# Altium footprint library TarabusLibrary.PcbLib: 591 footprints (part 14 of 37)
Each footprint in its own frame and in the unit in brackets; x right, y up, seen from the top. Pads: shape width x height; smd on the part's side, far side on the other; paste and mask are expansions set on the pad; w line width, h text height; cw(c..) or ccw(c..) is an arc to the next point about the centre after c.
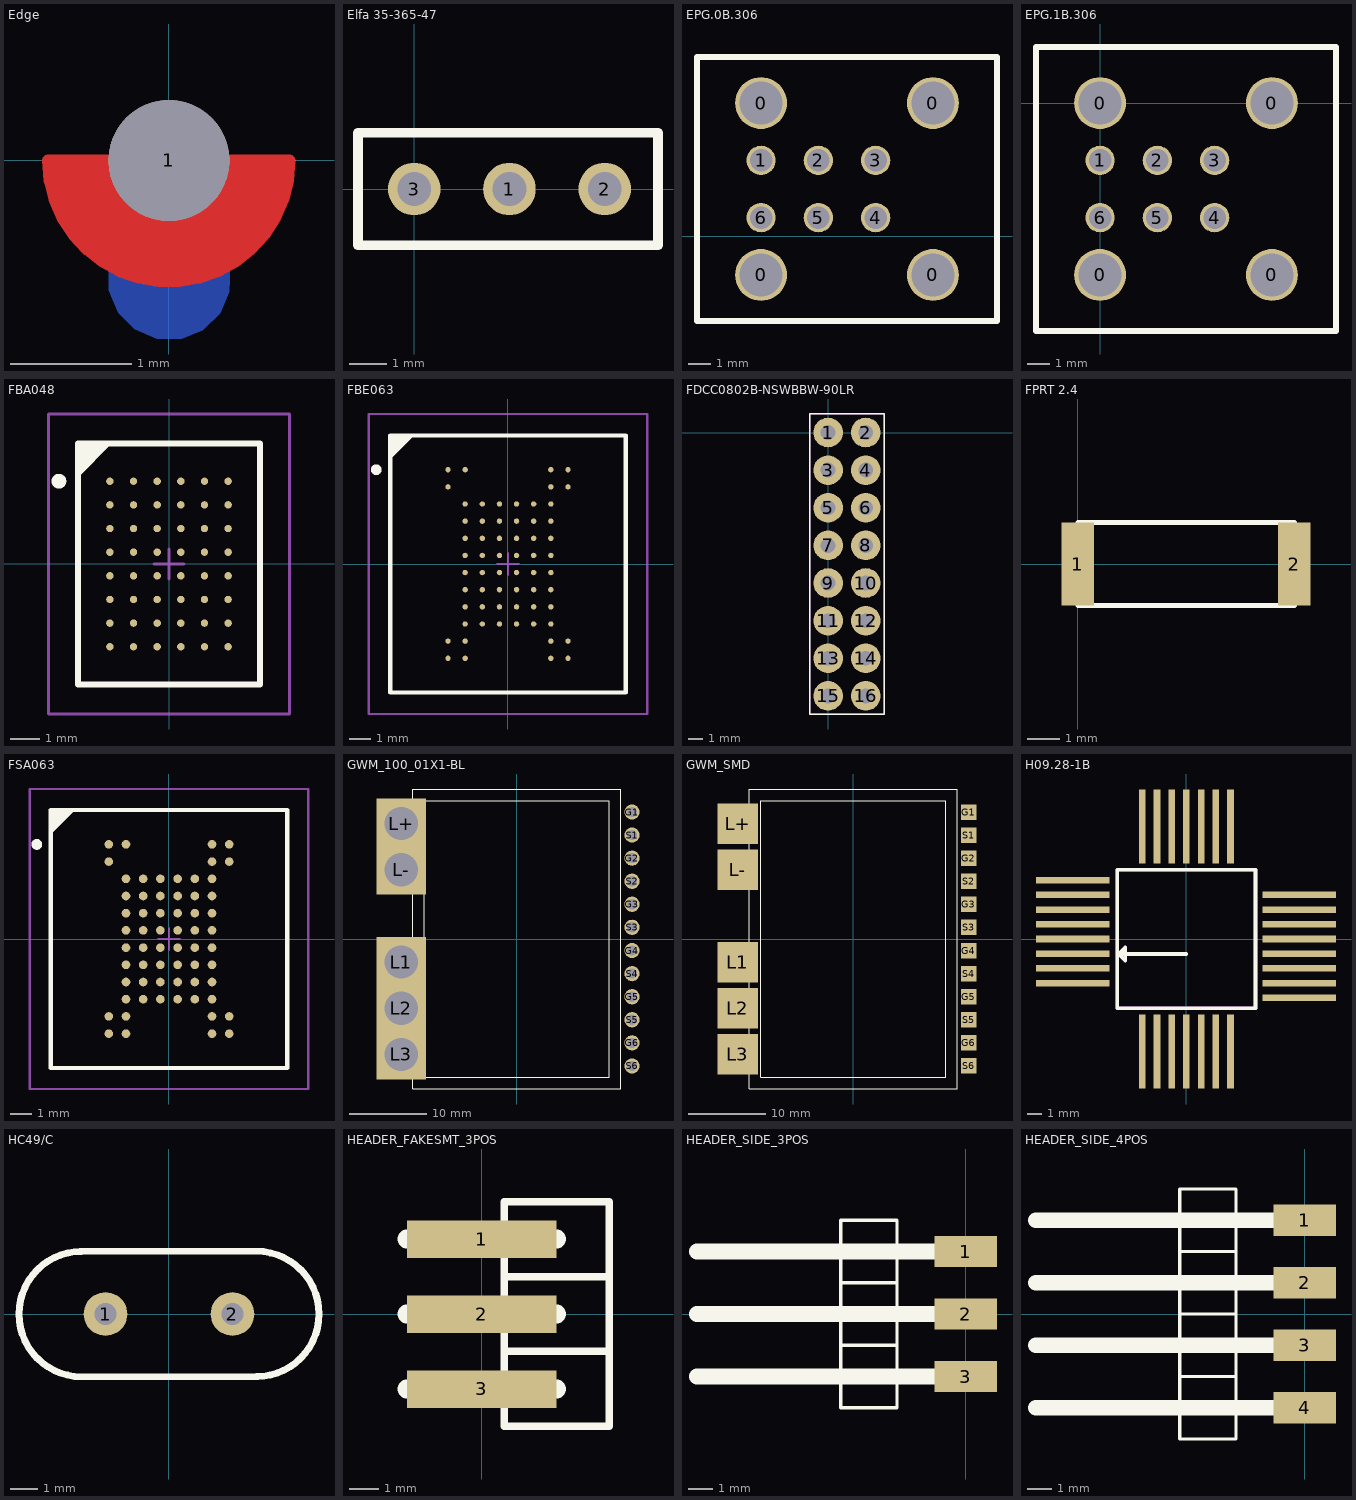
[diagram p13: the footprints below, top view; thin cyan lines are the x and y axes]

## Edge [mm]
pads (1):
  round 1 hole 1: 1(0,0)
Top Layer:
  region: -1,0 -1,-0.132 -0.932,-0.386 -0.8,-0.614 -0.614,-0.8 -0.386,-0.932 -0.132,-1 0.132,-1 0.386,-0.932 0.614,-0.8 0.8,-0.614 0.932,-0.386 1,-0.132 1,0
  lines w0.1: -1,0 ccw(c0,0) 1,0 ; -1,0 0,0 ; -1,0 0,0 ; 0,0 1,0 ; 0,0 1,0
Signal Layer 1:
  region: -0.998,0.006 -0.998,-0.126 -0.93,-0.38 -0.798,-0.609 -0.612,-0.795 -0.384,-0.926 -0.13,-0.994 0.134,-0.994 0.388,-0.926 0.616,-0.795 0.802,-0.609 0.934,-0.38 1.002,-0.126 1.002,0.005 1.002,0.006
  lines w0.1: -0.998,0.006 ccw(c0.002,0.006) 1.002,0.006 ; -0.998,0.006 0.002,0.006 ; -0.998,0.006 0.002,0.006 ; 0.002,0.006 1.002,0.006 ; 0.002,0.006 1.002,0.006
Signal Layer 2:
  region: -0.998,0.006 -0.998,-0.126 -0.93,-0.38 -0.798,-0.609 -0.612,-0.795 -0.384,-0.926 -0.13,-0.994 0.134,-0.994 0.388,-0.926 0.616,-0.795 0.802,-0.609 0.934,-0.38 1.002,-0.126 1.002,0.005 1.002,0.006
  lines w0.1: -0.998,0.006 ccw(c0.002,0.006) 1.002,0.006 ; -0.998,0.006 0.002,0.006 ; -0.998,0.006 0.002,0.006 ; 0.002,0.006 1.002,0.006 ; 0.002,0.006 1.002,0.006
Bottom Layer:
  region: -0.497,-0.977 -0.497,-1.076 -0.421,-1.259 -0.282,-1.4 -0.1,-1.477 0.098,-1.478 0.282,-1.405 0.423,-1.267 0.502,-1.085 0.504,-0.986 0.504,0.014 -0.496,0.014

## Elfa 35-365-47 [mm]
pads (3):
  round 1.4 hole 0.9: 1(2.54,0) 2(5.08,0) 3(0,0)
Top Overlay:
  lines w0.254: -1.5,-1.5 -1.5,1.5 6.5,1.5 6.5,-1.5 -1.5,-1.5

## EPG.0B.306 [mm]
pads (10):
  round 2.3 hole 1.9: 0(-13.5,-1.72) 0(-13.5,5.9) 0(-5.88,-1.72) 0(-5.88,5.9)
  round 1.3 hole 1: 1(-13.5,3.36) 2(-10.96,3.36) 3(-8.42,3.36) 4(-8.42,0.82) 5(-10.96,0.82) 6(-13.5,0.82)
Top Overlay:
  lines w0.254: -16.34,-3.76 -16.34,7.94 -3.04,7.94 -3.04,-3.76 -16.34,-3.76

## EPG.1B.306 [mm]
pads (10):
  round 2.3 hole 1.9: 0(0,-7.62) 0(0,0) 0(7.62,-7.62) 0(7.62,0)
  round 1.3 hole 1: 1(0,-2.54) 2(2.54,-2.54) 3(5.08,-2.54) 4(5.08,-5.08) 5(2.54,-5.08) 6(0,-5.08)
Top Overlay:
  lines w0.254: -2.84,-10.11 -2.84,2.49 10.46,2.49 10.46,-10.11 -2.84,-10.11

## FBA048 [mm] "48-Ball Fine Pitch Ball Grid Array Rectangular 0.8 mm Pitch"
height 1.2
pads (48):
  round 0.25 smd: A1(-2,2.8) A2(-1.2,2.8) A3(-0.4,2.8) A4(0.4,2.8) A5(1.2,2.8) A6(2,2.8) B1(-2,2) B2(-1.2,2) B3(-0.4,2) B4(0.4,2) B5(1.2,2) B6(2,2) C1(-2,1.2) C2(-1.2,1.2) C3(-0.4,1.2) C4(0.4,1.2) C5(1.2,1.2) C6(2,1.2) D1(-2,0.4) D2(-1.2,0.4) D3(-0.4,0.4) D4(0.4,0.4) D5(1.2,0.4) D6(2,0.4) E1(-2,-0.4) E2(-1.2,-0.4) E3(-0.4,-0.4) E4(0.4,-0.4) E5(1.2,-0.4) E6(2,-0.4) F1(-2,-1.2) F2(-1.2,-1.2) F3(-0.4,-1.2) F4(0.4,-1.2) F5(1.2,-1.2) F6(2,-1.2) G1(-2,-2) G2(-1.2,-2) G3(-0.4,-2) G4(0.4,-2) G5(1.2,-2) G6(2,-2) H1(-2,-2.8) H2(-1.2,-2.8) H3(-0.4,-2.8) H4(0.4,-2.8) H5(1.2,-2.8) H6(2,-2.8)
Top Overlay:
  circle w0.25: c-3.725,2.8 r0.125
  region: -2.075,4.075 -3.075,3.075 -3.075,4.075
  lines w0.2: -3.075,3.075 -2.075,4.075 ; -3.075,-4.075 -3.075,4.075 3.075,4.075 3.075,-4.075 -3.075,-4.075
Mechanical 13:
  lines w0.1: -3.075,-4.075 -3.075,4.075 3.075,4.075 3.075,-4.075 -3.075,-4.075
Mechanical 15:
  lines w0.1: -0.5,0 0.5,0 ; 0,-0.5 0,0.5 ; -4.075,-5.075 -4.075,5.075 4.075,5.075 4.075,-5.075 -4.075,-5.075
3D body: height 1.2, standoff 0, extent -3.075,-4.075 3.075,4.075

## FBE063 [mm] "63-Ball Fine Pitch Ball Grid Array Rectangular 0.8 mm Pitch"
height 1.2
pads (63):
  round 0.25 smd: A1(-2.8,4.4) A2(-2,4.4) A7(2,4.4) A8(2.8,4.4) B1(-2.8,3.6) B7(2,3.6) B8(2.8,3.6) C2(-2,2.8) C3(-1.2,2.8) C4(-0.4,2.8) C5(0.4,2.8) C6(1.2,2.8) C7(2,2.8) D2(-2,2) D3(-1.2,2) D4(-0.4,2) D5(0.4,2) D6(1.2,2) D7(2,2) E2(-2,1.2) E3(-1.2,1.2) E4(-0.4,1.2) E5(0.4,1.2) E6(1.2,1.2) E7(2,1.2) F2(-2,0.4) F3(-1.2,0.4) F4(-0.4,0.4) F5(0.4,0.4) F6(1.2,0.4) F7(2,0.4) G2(-2,-0.4) G3(-1.2,-0.4) G4(-0.4,-0.4) G5(0.4,-0.4) G6(1.2,-0.4) G7(2,-0.4) H2(-2,-1.2) H3(-1.2,-1.2) H4(-0.4,-1.2) H5(0.4,-1.2) H6(1.2,-1.2) H7(2,-1.2) J2(-2,-2) J3(-1.2,-2) J4(-0.4,-2) J5(0.4,-2) J6(1.2,-2) J7(2,-2) K2(-2,-2.8) K3(-1.2,-2.8) K4(-0.4,-2.8) K5(0.4,-2.8) K6(1.2,-2.8) K7(2,-2.8) L1(-2.8,-3.6) L2(-2,-3.6) L7(2,-3.6) L8(2.8,-3.6) M1(-2.8,-4.4) M2(-2,-4.4) M7(2,-4.4) M8(2.8,-4.4)
Top Overlay:
  circle w0.25: c-6.15,4.4 r0.125
  region: -4.5,6 -5.5,5 -5.5,6
  lines w0.2: -5.5,5 -4.5,6 ; -5.5,-6 -5.5,6 5.5,6 5.5,-6 -5.5,-6
Mechanical 13:
  lines w0.1: -5.5,-6 -5.5,6 5.5,6 5.5,-6 -5.5,-6
Mechanical 15:
  lines w0.1: -0.5,0 0.5,0 ; 0,-0.5 0,0.5 ; -6.5,-7 -6.5,7 6.5,7 6.5,-7 -6.5,-7
3D body: height 1.2, standoff 0, extent -5.5,-6 5.5,6

## FDCC0802B-NSWBBW-90LR [mm]
pads (16):
  round 2 hole 1 mask+0: 1(0,0) 2(2.54,0) 3(0,-2.54) 4(2.54,-2.54) 5(0,-5.08) 6(2.54,-5.08) 7(0,-7.62) 8(2.54,-7.62) 9(0,-10.16) 10(2.54,-10.16) 11(0,-12.7) 12(2.54,-12.7) 13(0,-15.24) 14(2.54,-15.24) 15(0,-17.78) 16(2.54,-17.78)
Top Overlay:
  lines w0.1: -1.25,-19 -1.25,1.25 3.8,1.25 3.8,-19 -1.25,-19
Mechanical 7:
  lines w0.1: -1.25,-19 3.8,-19 3.8,1.25 -1.25,1.25 -1.25,-19

## FPRT 2.4 [mm]
pads (2):
  rect 1x2.54 smd mask+0: 1(0,0) 2(6.6,0)
Top Overlay:
  lines w0.15: 0.01,-1.27 6.61,-1.27 6.61,1.27 0.01,1.27 0.01,-1.27
3D body: height 1.7, standoff 0, extent 0.01,-1.27 6.6,1.27

## FSA063 [mm] "63-Ball Fine Pitch Ball Grid Array Rectangular 0.8 mm Pitch"
height 1.7
pads (63):
  round 0.4 smd: A1(-2.8,4.4) A2(-2,4.4) A7(2,4.4) A8(2.8,4.4) B1(-2.8,3.6) B7(2,3.6) B8(2.8,3.6) C2(-2,2.8) C3(-1.2,2.8) C4(-0.4,2.8) C5(0.4,2.8) C6(1.2,2.8) C7(2,2.8) D2(-2,2) D3(-1.2,2) D4(-0.4,2) D5(0.4,2) D6(1.2,2) D7(2,2) E2(-2,1.2) E3(-1.2,1.2) E4(-0.4,1.2) E5(0.4,1.2) E6(1.2,1.2) E7(2,1.2) F2(-2,0.4) F3(-1.2,0.4) F4(-0.4,0.4) F5(0.4,0.4) F6(1.2,0.4) F7(2,0.4) G2(-2,-0.4) G3(-1.2,-0.4) G4(-0.4,-0.4) G5(0.4,-0.4) G6(1.2,-0.4) G7(2,-0.4) H2(-2,-1.2) H3(-1.2,-1.2) H4(-0.4,-1.2) H5(0.4,-1.2) H6(1.2,-1.2) H7(2,-1.2) J2(-2,-2) J3(-1.2,-2) J4(-0.4,-2) J5(0.4,-2) J6(1.2,-2) J7(2,-2) K2(-2,-2.8) K3(-1.2,-2.8) K4(-0.4,-2.8) K5(0.4,-2.8) K6(1.2,-2.8) K7(2,-2.8) L1(-2.8,-3.6) L2(-2,-3.6) L7(2,-3.6) L8(2.8,-3.6) M1(-2.8,-4.4) M2(-2,-4.4) M7(2,-4.4) M8(2.8,-4.4)
Top Overlay:
  circle w0.25: c-6.15,4.4 r0.125
  region: -4.5,6 -5.5,5 -5.5,6
  lines w0.2: -5.5,5 -4.5,6 ; -5.5,-6 -5.5,6 5.5,6 5.5,-6 -5.5,-6
Mechanical 13:
  lines w0.1: -5.475,-5.975 -5.475,5.975 5.475,5.975 5.475,-5.975 -5.475,-5.975
Mechanical 15:
  lines w0.1: -0.5,0 0.5,0 ; 0,-0.5 0,0.5 ; -6.475,-6.975 -6.475,6.975 6.475,6.975 6.475,-6.975 -6.475,-6.975
3D body: height 1.7, standoff 0, extent -5.475,-5.975 5.475,5.975

## GWM_100_01X1-BL [mil]
pads (17):
  round 78 hole 52: G1(591,650) G2(591,414) G3(591,178) G4(591,-59.06) G5(591,-295.28) G6(591,-531.5) S1(591,532) S2(591,296) S3(591,60) S4(591,-177.17) S5(591,-413.39) S6(591,-649.61)
  rect 255x255 hole 170: L1(-590.55,-118.11) L2(-590.55,-354.33) L3(-590.55,-590.55) L+(-590.55,591) L-(-590.55,355)
Top Overlay:
  lines w5: -531.5,-767.72 -531.5,768 532,768 532,-767.72 -531.5,-767.72 ; -472.44,-708.66 473,-708.66 473,709 -472.44,709 -472.44,-708.66

## GWM_SMD [mil]
pads (17):
  rect 79x79 smd: G1(591,650) G2(591,414) G3(591,178) G4(591,-59.06) G5(591,-295.28) G6(591,-531.5) S1(591,532) S2(591,296) S3(591,60) S4(591,-177.17) S5(591,-413.39) S6(591,-649.61)
  rect 207x207 smd: L1(-590.55,-118.11) L2(-590.55,-354.33) L3(-590.55,-590.55) L+(-590.55,591) L-(-590.55,355)
Top Overlay:
  lines w5: -531.5,-767.72 532,-767.72 532,768 -531.5,768 -531.5,-767.72 ; -472.44,-708.66 -472.44,709 473,709 473,-708.66 -472.44,-708.66

## H09.28-1B [mm]
height 3
pads (30):
  rect 5x0.45 smd: 0(-7.725,4) 0(7.675,-4) 1(-7.725,-1) 2(-7.725,-2) 3(-7.725,-3) 11(7.675,-3) 12(7.675,-2) 13(7.675,-1) 14(7.675,0) 15(7.675,1) 16(7.675,2) 17(7.675,3) 25(-7.725,3) 26(-7.725,2) 27(-7.725,1) 28(-7.725,0)
  rect 0.45x5 smd: 4(-3,-7.65) 5(-2,-7.65) 6(-1,-7.65) 7(0,-7.65) 8(1,-7.65) 9(2,-7.65) 10(3,-7.65) 18(3,7.65) 19(2,7.65) 20(1,7.65) 21(0,7.65) 22(-1,7.65) 23(-2,7.65) 24(-3,7.65)
Top Overlay:
  lines w0.254: -4.7,-1.025 -0.025,-1.025 ; -4.7,-4.7 -4.7,4.7 4.7,4.7 4.7,-4.7 -4.7,-4.7 ; -4.6,-1.025 -4.15,-1.475 -4.15,-0.575 -4.6,-1.025
Mechanical 7:
  lines w0.254: -4.7,-1.025 -0.025,-1.025 ; -4.7,-4.7 4.7,-4.7 4.7,4.7 -4.7,4.7 -4.7,-4.7 ; -4.6,-1.025 -4.15,-0.575 -4.15,-1.475 -4.6,-1.025
3D body: height 3, standoff 0.05, extent -4.7,-4.7 4.7,4.7

## HC49/C [mm]
height 4.2
pads (2):
  round 1.6 hole 0.8: 1(-2.325,0) 2(2.325,0)
Top Overlay:
  lines w0.254: -3.25,-2.3 3.25,-2.3 ; -3.25,2.3 3.275,2.3 ; -3.2,-2.3 cw(c-3.2,-0.002) -3.2,2.296 ; 3.2,-2.296 ccw(c3.2,0.002) 3.2,2.3
3D body: height 4.2, standoff 0.05, extent -5.5,-2.3 5.525,2.3

## HEADER_FAKESMT_3POS [mm]
pads (3):
  rect 5.08x1.27 smd: 1(0,2.54) 2(0,0) 3(0,-2.54)
Top Overlay:
  lines w0.254: 0.762,-1.27 4.318,-1.27 ; 0.762,-1.27 0.762,1.27 ; 0.762,-1.27 0.762,-3.81 4.318,-3.81 4.318,-1.27 ; 0.762,1.27 4.318,1.27 ; 0.762,1.27 0.762,3.81 4.318,3.81 4.318,1.27 ; 4.318,-1.27 4.318,1.27
  lines w0.635: -2.54,-2.54 2.54,-2.54 ; -2.54,0 2.54,0 ; -2.54,2.54 2.54,2.54

## HEADER_SIDE_3POS [mm]
pads (3):
  rect 2.54x1.27 smd: 1(0,2.54) 2(0,0) 3(0,-2.54)
Top Overlay:
  lines w0.127: -5.08,-1.27 -2.794,-1.27 ; -5.08,-1.27 -5.08,-3.81 -2.794,-3.81 -2.794,-1.27 ; -5.08,-1.27 -5.08,1.27 ; -5.08,1.27 -2.794,1.27 ; -5.08,1.27 -5.08,3.81 -2.794,3.81 -2.794,1.27 ; -2.794,-1.27 -2.794,1.27
  lines w0.635: -10.922,-2.54 -0.508,-2.54 ; -10.922,0 -0.508,0 ; -10.922,2.54 -0.508,2.54

## HEADER_SIDE_4POS [mm]
pads (4):
  rect 2.54x1.27 smd: 1(0,3.81) 2(0,1.27) 3(0,-1.27) 4(0,-3.81)
Top Overlay:
  lines w0.127: -2.794,-2.54 -5.08,-2.54 ; -5.08,-2.54 -5.08,0 ; -5.08,-2.54 -5.08,-5.08 -2.794,-5.08 -2.794,0 ; -5.08,0 -5.08,2.54 ; -5.08,0 -2.794,0 ; -5.08,2.54 -5.08,5.08 -2.794,5.08 -2.794,2.54 ; -5.08,2.54 -2.794,2.54 ; -2.794,0 -2.794,2.54
  lines w0.635: -10.922,-3.81 -0.508,-3.81 ; -10.922,-1.27 -0.508,-1.27 ; -10.922,1.27 -0.508,1.27 ; -10.922,3.81 -0.508,3.81